# Altium footprint library myPcb.PcbLib: 145 footprints (part 9 of 10)
Each footprint in its own frame and in the unit in brackets; x right, y up, seen from the top. Pads: shape width x height; smd on the part's side, far side on the other; paste and mask are expansions set on the pad; w line width, h text height; cw(c..) or ccw(c..) is an arc to the next point about the centre after c.
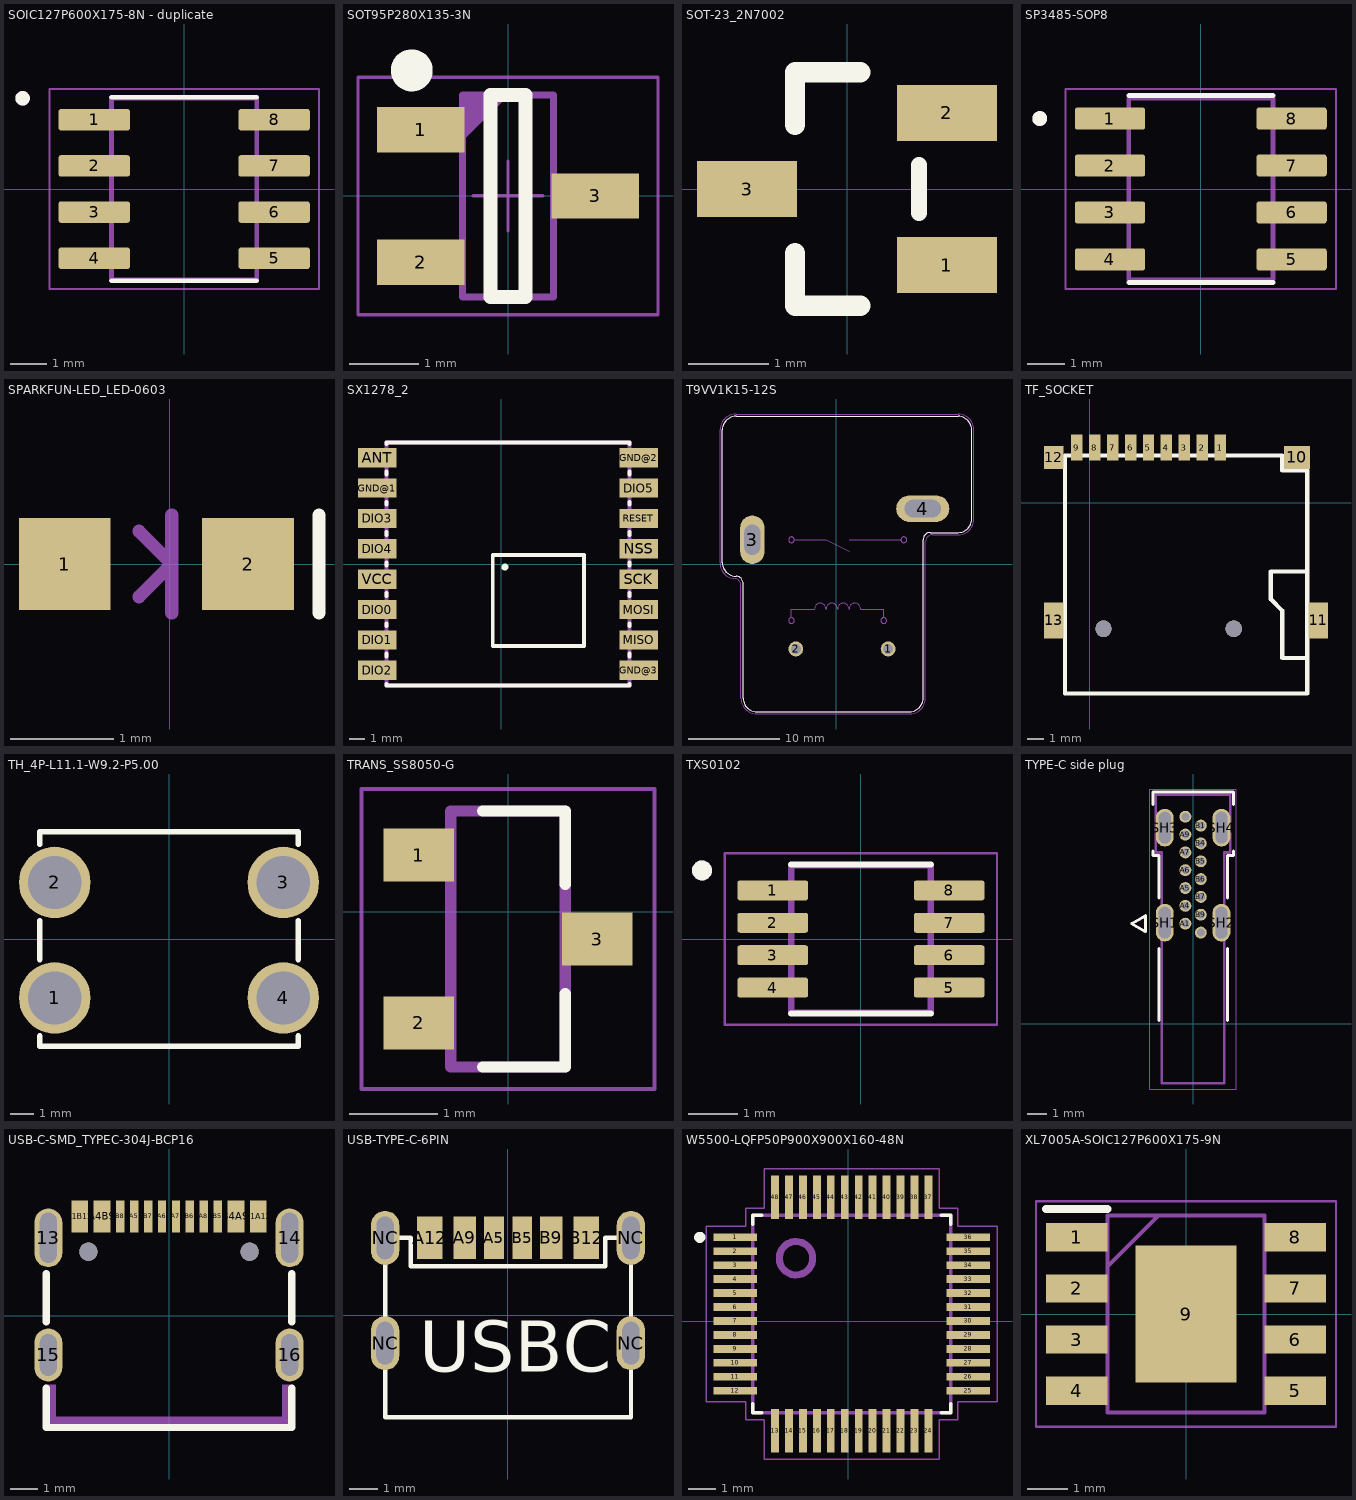
[diagram p8: the footprints below, top view; thin cyan lines are the x and y axes]

## SOIC127P600X175-8N - duplicate [mm]
pads (8):
  rrect25% 1.97x0.59 smd: 1(-2.475,1.905) 2(-2.475,0.635) 3(-2.475,-0.635) 4(-2.475,-1.905) 5(2.475,-1.905) 6(2.475,-0.635) 7(2.475,0.635) 8(2.475,1.905)
Top Overlay:
  circle w0.2: c-4.445,2.495 r0.1
  lines w0.127: -2,-2.52 2,-2.52 ; -2,2.52 2,2.52
Mechanical 13:
  circle w0.2: c-4.445,2.495 r0.1
  lines w0.127: -2,-2.5 -2,2.5 2,2.5 2,-2.5 -2,-2.5
Mechanical 15:
  lines w0.05: -3.71,-2.75 -3.71,2.75 3.71,2.75 3.71,-2.75 -3.71,-2.75

## SOT95P280X135-3N [mm] "SM712"
pads (3):
  rect 1.25x0.65 smd: 1(-1.25,0.95) 2(-1.25,-0.95) 3(1.25,0)
Top Overlay:
  circle w0.4: c-1.38,1.8 r0.1
  lines w0.2: -0.25,-1.45 0.25,-1.45 0.25,1.45 -0.25,1.45 -0.25,-1.45
Top Assembly:
  lines w0.1: -0.65,0.85 -0.05,1.45 ; -0.65,0.95 -0.15,1.45 ; -0.65,1.05 -0.25,1.45 ; -0.65,1.15 -0.35,1.45 ; -0.65,1.25 -0.45,1.45 ; -0.65,1.35 -0.55,1.45 ; -0.65,-1.45 0.65,-1.45 0.65,1.45 -0.65,1.45 -0.65,-1.45
Mechanical 18:
  lines w0.05: -0.5,0 0.5,0 ; 0,-0.5 0,0.5 ; -2.15,-1.7 2.15,-1.7 2.15,1.7 -2.15,1.7 -2.15,-1.7
Mechanical 19:
  lines w0.001: -0.65,-1.45 0.65,-1.45 0.65,1.45 -0.65,1.45 -0.65,-1.45

## SOT-23_2N7002 [mm]
pads (3):
  rect 1.25x0.7 smd paste+0 mask+0.102: 1(1.25,-0.95) 2(1.25,0.95) 3(-1.25,0)
Top Overlay:
  lines w0.2: 0.9,-0.3 0.9,0.3
  lines w0.254: -0.65,-0.8 -0.65,-1.46 0.165,-1.46 ; 0.165,1.46 -0.65,1.46 ; -0.65,0.8 -0.65,1.46 ; -0.65,0.8 -0.65,1.46 ; -0.65,0.8 -0.65,1.46

## SP3485-SOP8 [mm]
pads (8):
  rrect25% 1.9x0.6 smd: 1(-2.455,1.905) 2(-2.455,0.635) 3(-2.455,-0.635) 4(-2.455,-1.905) 5(2.455,-1.905) 6(2.455,-0.635) 7(2.455,0.635) 8(2.455,1.905)
Top Overlay:
  circle w0.2: c-4.355,1.905 r0.1
  lines w0.127: -1.95,-2.525 1.95,-2.525 ; -1.95,2.525 1.95,2.525
Mechanical 13:
  circle w0.2: c-4.355,1.905 r0.1
  lines w0.127: -1.95,-2.45 1.95,-2.45 1.95,2.45 -1.95,2.45 -1.95,-2.45
Mechanical 15:
  lines w0.05: -3.655,-2.7 3.655,-2.7 3.655,2.7 -3.655,2.7 -3.655,-2.7
3D body "step_temp.STEP": height 1.75, standoff 0, extent -3,-2.45 3,2.45

## SPARKFUN-LED_LED-0603 [mil]
pads (2):
  rect 35x35 smd paste+0 mask+2: 1(-40,0) 2(30,0)
Top Overlay:
  lines w5: 57.11,-18.75 57.11,18.75
Mechanical 15:
  lines w5: -11.64,-12.5 0.86,0 ; -11.64,12.5 0.86,0 ; 0.86,-18.75 0.86,0 ; 0.86,18.75 0.86,0

## SX1278_2 [mm]
pads (16):
  rect 2.54x1.27 smd paste+0 mask+0.051: ANT(-8.153,7) DIO0(-8.153,-3) DIO1(-8.153,-5) DIO2(-8.153,-7) DIO3(-8.153,3) DIO4(-8.153,1) DIO5(9.047,5) GND@1(-8.153,5) GND@2(9.047,7) GND@3(9.047,-7) MISO(9.047,-5) MOSI(9.047,-3) NSS(9.047,1) RESET(9.047,3) SCK(9.047,-1) VCC(-8.153,-1)
Top Overlay:
  lines w0.254: -7.553,-7.9 -7.553,-8 8.447,-8 8.447,-7.9 ; -7.553,-6.1 -7.553,-5.9 ; -7.553,-4.1 -7.553,-3.9 ; -7.553,-2.1 -7.553,-1.9 ; -7.553,-0.1 -7.553,0.1 ; -7.553,1.9 -7.553,2.1 ; -7.553,3.9 -7.553,4.1 ; -7.553,5.9 -7.553,6.1 ; -7.553,7.9 -7.553,8 8.447,8 8.447,7.9 ; 0.347,-0.204 cw(c0.247,-0.202) 0.347,-0.2 ; 8.447,-6.1 8.447,-5.9 ; 8.447,-4.1 8.447,-3.9 ; 8.447,-2.1 8.447,-1.9 ; 8.447,-0.1 8.447,0.1 ; 8.447,1.9 8.447,2.1 ; 8.447,3.9 8.447,4.1 ; 8.447,5.9 8.447,6.1 ; -0.553,-5.4 -0.553,0.6 5.447,0.6 5.447,-5.4 -0.553,-5.4
Mechanical 15:
  lines w0.254: -7.553,-8 -7.553,8 8.447,8 8.447,-8 -7.553,-8
  text "SX1278" at 0.252,-2.806 h0.81

## T9VV1K15-12S [mm]
pads (4):
  round 1.635 hole 1.09: 1(5.692,-9.343) 2(-4.468,-9.343)
  oval 2.67x5.34 hole 1.78 slot 3.33 at 90 deg: 3(-9.248,2.667)
  oval 5.85x2.925 hole 1.95 slot 4 at 0 deg: 4(9.502,6.097)
Top Overlay:
  lines w0.127: -12.548,0.156 ccw(c-11.048,0.156) -11.048,-1.344 -11.024,-1.344 cw(c-11.024,-2.106) -10.262,-2.106 -10.262,-14.754 ccw(c-8.762,-14.754) -8.762,-16.254 8.05,-16.254 ccw(c8.05,-14.754) 9.55,-14.754 9.55,2.694 cw(c10.312,2.694) 10.312,3.456 13.382,3.456 ccw(c13.382,4.956) 14.882,4.956 14.882,14.756 ccw(c13.382,14.756) 13.382,16.256 -11.048,16.256 ccw(c-11.048,14.756) -12.548,14.756 -12.548,0.156
Mechanical 13:
  circle w0.127: c-4.953,-6.223 r0.318
  circle w0.127: c5.207,-6.223 r0.318
  circle w0.127: c7.417,2.667 r0.318
  circle w0.127: c-4.953,2.667 r0.318
  lines w0.127: -12.548,0.156 ccw(c-11.048,0.156) -11.048,-1.344 -11.024,-1.344 cw(c-11.024,-2.106) -10.262,-2.106 -10.262,-14.754 ccw(c-8.762,-14.754) -8.762,-16.254 8.05,-16.254 ccw(c8.05,-14.754) 9.55,-14.754 9.55,2.694 cw(c10.312,2.694) 10.312,3.456 13.382,3.456 ccw(c13.382,4.956) 14.882,4.956 14.882,14.756 ccw(c13.382,14.756) 13.382,16.256 -11.048,16.256 ccw(c-11.048,14.756) -12.548,14.756 -12.548,0.156 ; -4.953,-5.823 -4.953,-4.953 -2.413,-4.953 cw(c-1.778,-4.953) -1.143,-4.953 cw(c-0.508,-4.953) 0.127,-4.953 cw(c0.762,-4.953) 1.397,-4.953 cw(c2.032,-4.953) 2.667,-4.953 5.207,-4.953 5.207,-5.823 ; -4.583,2.667 -1.143,2.667 1.397,1.397 ; 1.397,2.667 7.047,2.667
Mechanical 15:
  lines w0.05: -12.799,0.145 ccw(c-11.173,0.031) -11.287,-1.595 ; -12.798,0.156 -12.798,14.756 cw(c-11.048,14.756) -11.048,16.506 13.382,16.506 cw(c13.382,14.756) 15.132,14.756 15.132,4.956 cw(c13.382,4.956) 13.382,3.206 10.562,3.206 ccw(c10.562,2.444) 9.8,2.444 9.8,-14.754 cw(c8.05,-14.754) 8.05,-16.504 -8.762,-16.504 cw(c-8.762,-14.754) -10.512,-14.754 -10.512,-2.356 ; -11.274,-1.594 cw(c-11.274,-2.356) -10.512,-2.356 ; -10.512,-2.106 -10.512,-2.356

## TF_SOCKET [mm]
height 2
pads (13):
  rect 0.7x1.6 smd: 1(8,3.4) 2(6.9,3.4) 3(5.8,3.4) 4(4.7,3.4) 5(3.6,3.4) 6(2.5,3.4) 7(1.4,3.4) 8(0.3,3.4) 9(-0.8,3.4)
  rect 1.6x1.4 smd: 10(12.7,2.8)
  rect 1.2x2.2 smd: 11(14,-7.2) 13(-2.2,-7.2)
  rect 1.2x1.4 smd: 12(-2.2,2.8)
via 8.838,-7.709 diameter 1 hole 1
via 0.838,-7.709 diameter 1 hole 1
Top Overlay:
  lines w0.254: 13.3,-9.5 11.8,-9.5 11.8,-8.2 11.8,-6.6 11.1,-5.9 11.1,-4.2 13.3,-4.2 ; -1.524,-11.684 9.271,-11.684 13.335,-11.684 13.335,2 11.8,2 11.8,2.9 11.779,2.921 -1.524,2.921 -1.524,-11.684
3D body "User Library-MEM2055-00-190-01-A_revG.STEP": height 1.85, standoff -0.6, extent -2.224,-11.557 13.776,3.693

## TH_4P-L11.1-W9.2-P5.00 [mm] "PCB安装4脚金属接线端子"
pads (4):
  round 3.1 hole 2.3 paste+0 mask+0.05: 1(-4.95,-2.55) 2(-4.95,2.45) 3(4.95,2.45) 4(4.95,-2.55)
Top Overlay:
  lines w0.254: -5.6,-4.208 -5.6,-4.65 5.6,-4.65 5.6,-4.208 ; -5.6,-0.892 -5.6,0.792 ; -5.6,4.108 -5.6,4.65 5.6,4.65 5.6,4.108 ; 5.6,-0.892 5.6,0.792

## TRANS_SS8050-G [mil]
pads (3):
  rect 31.5x23.62 smd paste+0 mask+2: 1(-39.76,25.14) 2(-39.76,-49.66) 3(39.76,-12.26)
Top Overlay:
  lines w5: -11.42,-69.35 25.59,-69.35 25.59,-36.67 ; -11.42,44.83 25.59,44.83 25.59,12.15
Mechanical 15:
  lines w1.97: -65.35,-79.19 -65.35,54.67 65.35,54.67 65.35,-79.19 -65.35,-79.19
  lines w5: -25.59,-69.35 25.59,-69.35 25.59,44.83 -25.59,44.83 -25.59,-69.35

## TXS0102 [mm]
pads (8):
  rrect25% 1.42x0.4 smd: 1(-1.77,0.975) 2(-1.77,0.325) 3(-1.77,-0.325) 4(-1.77,-0.975) 5(1.77,-0.975) 6(1.77,-0.325) 7(1.77,0.325) 8(1.77,0.975)
Top Overlay:
  circle w0.2: c-3.19,1.375 r0.1
  lines w0.127: -1.4,-1.495 1.4,-1.495 ; -1.4,1.495 1.4,1.495
Mechanical 13:
  circle w0.2: c-3.19,1.375 r0.1
  lines w0.127: -1.4,-1.475 1.4,-1.475 1.4,1.475 -1.4,1.475 -1.4,-1.475
Mechanical 15:
  lines w0.05: -2.73,-1.725 2.73,-1.725 2.73,1.725 -2.73,1.725 -2.73,-1.725
3D body "step_temp.STEP": height 1.3, standoff 0, extent -2,-1.475 2,1.475

## TYPE-C side plug [mm]
height 9.04
pads (18):
  round 0.6 hole 0.4 mask+0.064: A1(-0.39,5.05) A4(-0.39,5.95) A5(-0.39,6.85) A6(-0.39,7.75) A7(-0.39,8.65) A9(-0.39,9.55) A12(-0.39,10.45) B1(0.39,10) B4(0.39,9.1) B5(0.39,8.2) B6(0.39,7.3) B7(0.39,6.4) B9(0.39,5.5) B12(0.39,4.6)
  oval 0.9x1.9 hole 0.6 slot 1.6 at 90 deg mask+0.064: SH1(-1.43,5.1) SH2(1.43,5.1) SH3(-1.43,9.9) SH4(1.43,9.9)
Top Overlay:
  lines w0.15: -2.03,8.725 -2.03,8.495 -1.73,8.495 -1.73,6.35 ; -2.03,11.075 -2.03,11.7 2.03,11.7 2.03,11.075 ; -1.73,0.15 -1.73,3.8 ; 1.73,0.15 1.73,3.8 ; 1.73,6.35 1.73,8.495 2.03,8.495 2.03,8.725 ; -3.1,5.05 -2.4,4.65 -2.4,5.45 -3.1,5.05
Mechanical 12:
  text "PTH Drill 04 +/- 0.05" at -1.905,15.24 h0.5
  text "PTH Slot 1.6 +/- 0.05 X 0.6 +/- 0.05" at -1.905,15.897 h0.5
Mechanical 13:
  lines w0.13: -3.1,5.05 -2.4,4.65 -2.4,5.45 -3.1,5.05 ; -1.88,8.645 -1.88,11.55 1.88,11.55 1.88,8.645 1.58,8.645 1.58,-3 -1.58,-3 -1.58,0 -1.58,8.645 -1.88,8.645
Mechanical 15:
  lines w0.01: -2.18,-3.3 2.18,-3.3 2.18,11.85 -2.18,11.85 -2.18,-3.3

## USB-C-SMD_TYPEC-304J-BCP16 [mm]
pads (18):
  oval 1x2.1 hole 0.6 slot 1.8 at 90 deg paste+0 mask+0.051: 13(-4.325,2.795) 14(4.325,2.795)
  oval 1x1.9 hole 0.6 slot 1.5 at 90 deg paste+0 mask+0.051: 15(-4.325,-1.405) 16(4.325,-1.405)
  rect 0.6x1.15 smd paste-100 mask+0.051: A1B12(-3.2,3.557) A4B9(-2.4,3.557) B1A12(3.2,3.557) B4A9(2.4,3.557)
  rect 0.3x1.15 smd paste-100 mask+0.051: A5(-1.25,3.557) A6(-0.25,3.557) A7(0.25,3.557) A8(1.25,3.557) B5(1.75,3.557) B6(0.75,3.557) B7(-0.75,3.557) B8(-1.75,3.557)
  round 0.65 hole 0.65 unplated paste+0: ""(-2.89,2.295) ""(2.89,2.295)
Top Overlay:
  lines w0.254: -4.4,-2.583 -4.4,-4.005 4.4,-4.005 4.4,-2.583 ; -4.4,-0.228 -4.4,1.517 ; 4.4,-0.228 4.4,1.517
Top Paste:
  region: 3.825,-0.955 3.825,-0.856 3.901,-0.672 4.042,-0.531 4.226,-0.455 4.424,-0.455 4.608,-0.531 4.749,-0.672 4.825,-0.856 4.825,-0.955 4.825,-1.855 4.825,-1.955 4.749,-2.139 4.608,-2.279 4.424,-2.355 4.226,-2.355 4.042,-2.279 3.901,-2.139 3.825,-1.955 3.825,-1.855
  region: -4.825,-0.955 -4.825,-0.856 -4.749,-0.672 -4.608,-0.531 -4.424,-0.455 -4.226,-0.455 -4.042,-0.531 -3.901,-0.672 -3.825,-0.856 -3.825,-0.955 -3.825,-1.855 -3.825,-1.955 -3.901,-2.139 -4.042,-2.279 -4.226,-2.355 -4.424,-2.355 -4.608,-2.279 -4.749,-2.139 -4.825,-1.955 -4.825,-1.855
  region: 3.825,3.345 3.825,3.444 3.901,3.628 4.042,3.768 4.226,3.845 4.424,3.845 4.608,3.768 4.749,3.628 4.825,3.444 4.825,3.345 4.825,2.245 4.825,2.145 4.749,1.961 4.608,1.821 4.424,1.745 4.226,1.745 4.042,1.821 3.901,1.961 3.825,2.145 3.825,2.245
  region: -4.825,3.345 -4.825,3.444 -4.749,3.628 -4.608,3.768 -4.424,3.845 -4.226,3.845 -4.042,3.768 -3.901,3.628 -3.825,3.444 -3.825,3.345 -3.825,2.245 -3.825,2.145 -3.901,1.961 -4.042,1.821 -4.226,1.745 -4.424,1.745 -4.608,1.821 -4.749,1.961 -4.825,2.145 -4.825,2.245
  region: 2.9,4.132 3.5,4.132 3.5,2.982 2.9,2.982
  region: 2.1,4.132 2.7,4.132 2.7,2.982 2.1,2.982
  region: 1.6,4.132 1.9,4.132 1.9,2.982 1.6,2.982
  region: 1.1,4.132 1.4,4.132 1.4,2.982 1.1,2.982
  region: 0.6,4.132 0.9,4.132 0.9,2.982 0.6,2.982
  region: 0.1,4.132 0.4,4.132 0.4,2.982 0.1,2.982
  region: -0.4,4.132 -0.1,4.132 -0.1,2.982 -0.4,2.982
  region: -0.9,4.132 -0.6,4.132 -0.6,2.982 -0.9,2.982
  region: -1.4,4.132 -1.1,4.132 -1.1,2.982 -1.4,2.982
  region: -1.9,4.132 -1.6,4.132 -1.6,2.982 -1.9,2.982
  region: -2.7,4.132 -2.1,4.132 -2.1,2.982 -2.7,2.982
  region: -3.5,4.132 -2.9,4.132 -2.9,2.982 -3.5,2.982
Mechanical 15:
  circle w0.3: c2.89,2.295 r0.15
  circle w0.3: c-2.89,2.295 r0.15
  region: -4.445,-2.48 -4.445,-4.004 4.445,-4.004 4.445,-2.48 4.064,-2.48 4.064,-3.623 -4.064,-3.623 -4.064,-2.48

## USB-TYPE-C-6PIN [mm]
pads (10):
  rect 0.7x1.5 smd paste+0 mask+0.051: A5(-0.499,2.713) B5(0.501,2.713)
  rect 0.8x1.5 smd paste+0 mask+0.051: A9(-1.519,2.713) B9(1.521,2.713)
  rect 0.9x1.5 smd paste+0 mask+0.051: A12(-2.749,2.713) B12(2.751,2.713)
  oval 1x1.9 hole 0.6 slot 1.5 at 90 deg paste+0 mask+0.051: NC(-4.321,-0.987) NC(-4.319,2.713) NC(4.319,-0.987) NC(4.321,2.713)
Top Overlay:
  lines w0.152: 4.321,2.713 4.321,-3.587 -4.319,-3.587 -4.319,2.713 -3.42,2.713 -3.42,1.712 3.421,1.713 3.421,2.713 4.322,2.713
  text "USBC" at -3.119,-1.987 h1.8

## W5500-LQFP50P900X900X160-48N [mm] "W5500"
pads (48):
  rect 1.56x0.28 smd: 1(-4.053,3.004) 2(-4.053,2.504) 3(-4.053,2.004) 4(-4.053,1.504) 5(-4.053,1.004) 6(-4.053,0.504) 7(-4.053,0.004) 8(-4.053,-0.496) 9(-4.053,-0.996) 10(-4.053,-1.496) 11(-4.053,-1.996) 12(-4.053,-2.496) 25(4.307,-2.496) 26(4.307,-1.996) 27(4.307,-1.496) 28(4.307,-0.996) 29(4.307,-0.496) 30(4.307,0.004) 31(4.307,0.504) 32(4.307,1.004) 33(4.307,1.504) 34(4.307,2.004) 35(4.307,2.504) 36(4.307,3.004)
  rect 0.28x1.56 smd: 13(-2.623,-3.926) 14(-2.123,-3.926) 15(-1.623,-3.926) 16(-1.123,-3.926) 17(-0.623,-3.926) 18(-0.123,-3.926) 19(0.377,-3.926) 20(0.877,-3.926) 21(1.377,-3.926) 22(1.877,-3.926) 23(2.377,-3.926) 24(2.877,-3.926) 37(2.877,4.434) 38(2.377,4.434) 39(1.877,4.434) 40(1.377,4.434) 41(0.877,4.434) 42(0.377,4.434) 43(-0.123,4.434) 44(-0.623,4.434) 45(-1.123,4.434) 46(-1.623,4.434) 47(-2.123,4.434) 48(-2.623,4.434)
Top Overlay:
  circle w0.2: c-5.323,3.004 r0.1
  lines w0.127: -3.423,-2.966 -3.423,-3.296 -3.093,-3.296 ; -3.423,3.474 -3.423,3.804 -3.093,3.804 ; 3.347,-3.296 3.677,-3.296 3.677,-2.966 ; 3.347,3.804 3.677,3.804 3.677,3.474
Mechanical 13:
  drawing of 53 lines, arcs and shapes, not listed
Mechanical 15:
  lines w0.05: -5.083,-2.886 -5.083,3.394 -3.673,3.394 -3.673,4.054 -3.013,4.054 -3.013,5.464 3.267,5.464 3.267,4.054 3.927,4.054 3.927,3.394 5.337,3.394 5.337,-2.886 3.927,-2.886 3.927,-3.546 3.267,-3.546 3.267,-4.956 -3.013,-4.956 -3.013,-3.546 -3.673,-3.546 -3.673,-2.886 -5.083,-2.886

## XL7005A-SOIC127P600X175-9N [mm] "XL7005A"
pads (9):
  rect 1.525x0.7 smd: 1(-2.712,1.905) 2(-2.712,0.635) 3(-2.712,-0.635) 4(-2.712,-1.905) 5(2.712,-1.905) 6(2.712,-0.635) 7(2.712,0.635) 8(2.712,1.905)
  rect 2.513x3.402 smd: 9(0,0)
Top Overlay:
  lines w0.2: -3.475,2.605 -1.95,2.605
Mechanical 13:
  lines w0.05: -3.725,-2.8 3.725,-2.8 3.725,2.8 -3.725,2.8 -3.725,-2.8
  lines w0.1: -1.95,1.18 -0.68,2.45 ; -1.95,-2.45 1.95,-2.45 1.95,2.45 -1.95,2.45 -1.95,-2.45
3D body "step_temp.STEP": height 1.75, standoff 0, extent -3,-2.45 3,2.45